# Altium footprint library 试用版PCB3D封装库.PcbLib: 91 footprints (part 1 of 6)
Each footprint in its own frame and in the unit in brackets; x right, y up, seen from the top. Pads: shape width x height; smd on the part's side, far side on the other; paste and mask are expansions set on the pad; w line width, h text height; cw(c..) or ccw(c..) is an arc to the next point about the centre after c.
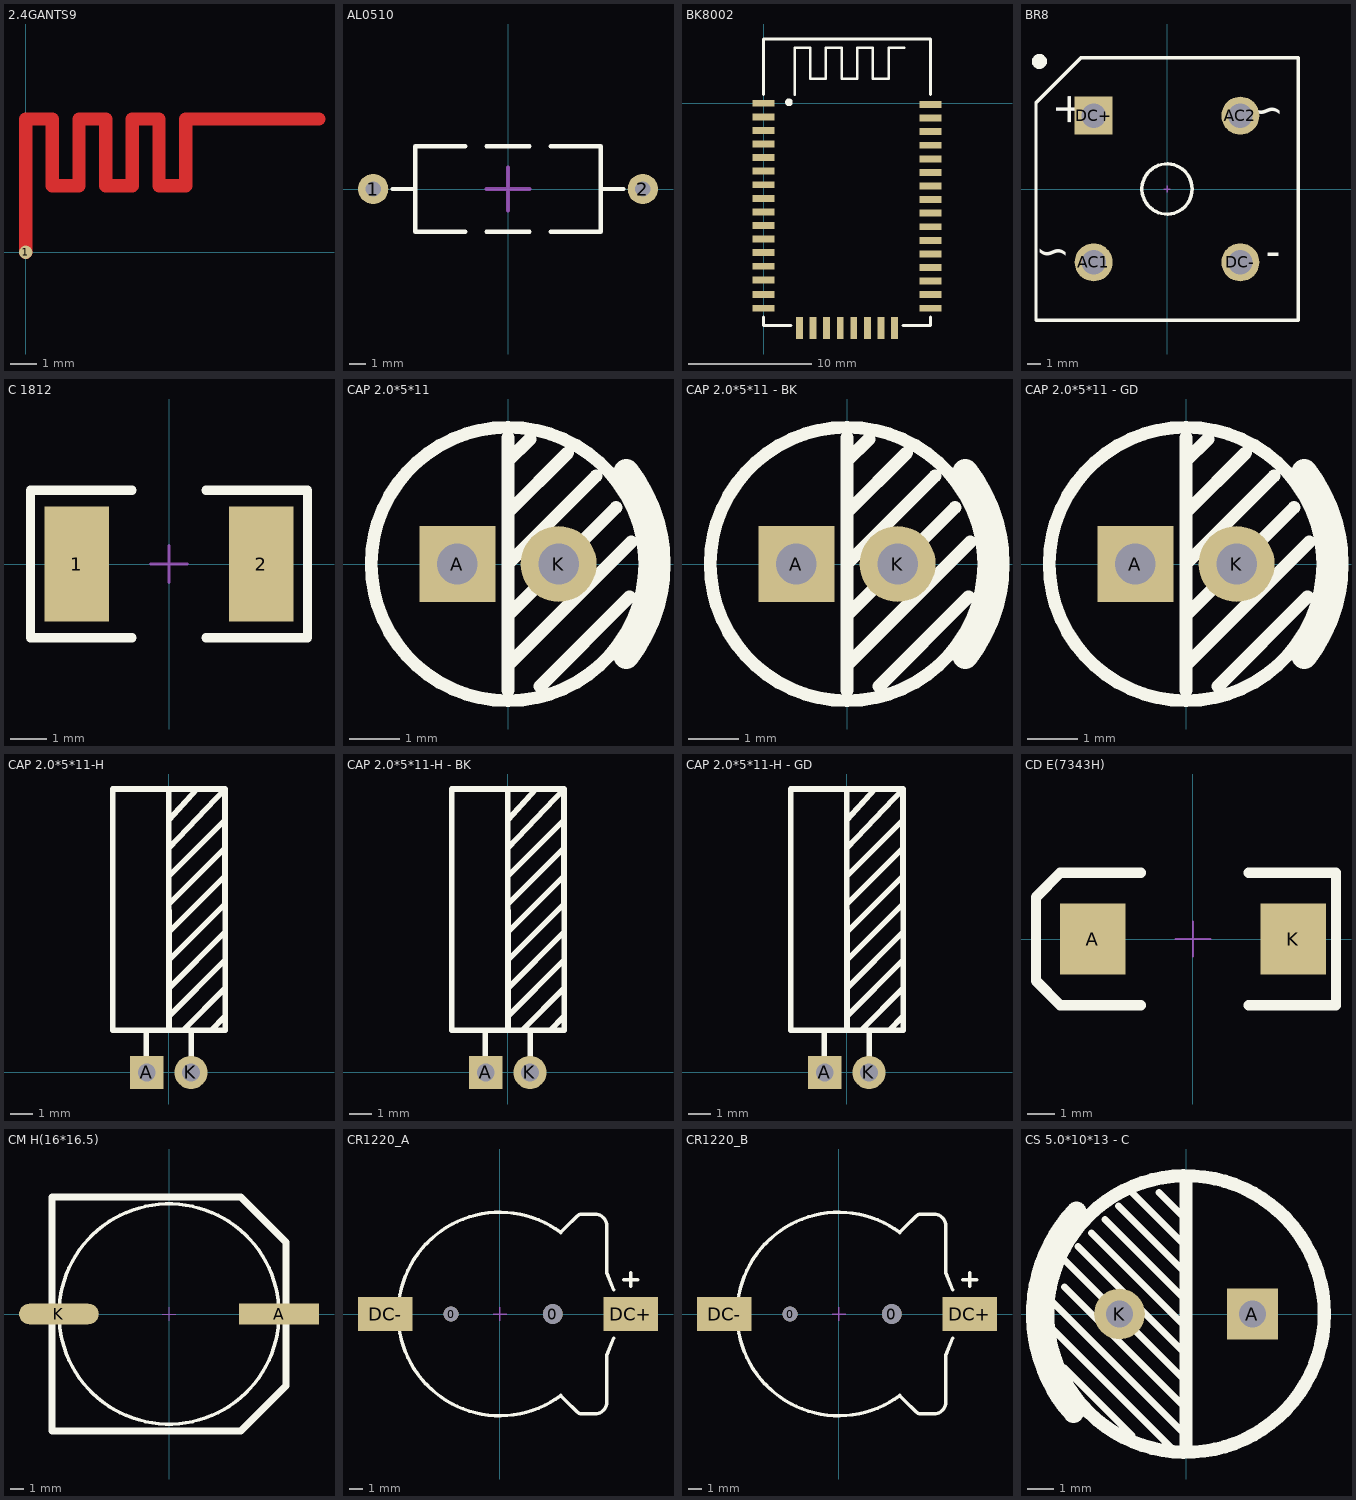
[diagram p0: the footprints below, top view; thin cyan lines are the x and y axes]

## 2.4GANTS9 [mm] "https://weidian.com/?userid=1231109981"
pads (1):
  round 0.5 smd: 1(0,0)
Top Layer:
  lines w0.5: 0,0 0,5 1,5 1,2.5 2,2.5 2,4.96 ; 2,5 3,5 3,2.5 4,2.5 4,4.99 ; 4,5 5,5 5,2.5 6,2.5 6,5 11,5

## AL0510 [mm] "16*5*10.5mm（脚距，直径，长度）"
pads (2):
  round 1.8 hole 0.9: 1(-8,0) 2(8,0)
Top Overlay:
  lines w0.254: -6.858,0 -5.5,0 ; -2.54,-2.54 -5.5,-2.54 -5.5,2.54 -2.54,2.54 ; -1.27,-2.54 1.27,-2.54 ; -1.27,2.54 1.27,2.54 ; 2.54,-2.54 5.5,-2.54 5.5,2.54 2.54,2.54 ; 5.5,0 6.858,0
Mechanical 15:
  lines w0.254: -1.27,0 1.27,0 ; 0,-1.27 0,1.27
3D body: height 5.06, standoff -3.5, extent -8.35,-2.509 8.35,2.509

## BK8002 [mil] "https://weidian.com/?userid=1231109981"
pads (40):
  rect 70x22 smd: 1(0,0) 2(0,-43.31) 3(0,-86.61) 4(0,-129.92) 5(0,-173.23) 6(0,-216.54) 7(0,-259.84) 8(0,-303.15) 9(0,-346.46) 10(0,-389.76) 11(0,-433.07) 12(0,-476.38) 13(0,-519.68) 14(0,-562.99) 15(0,-610.24) 16(0,-653.54) 25(531.5,-653.54) 26(531.5,-610.24) 27(531.5,-566.93) 28(531.5,-523.62) 29(531.5,-480.31) 30(531.5,-437.01) 31(531.5,-393.7) 32(531.5,-350.39) 33(531.5,-307.09) 34(531.5,-263.78) 35(531.5,-220.47) 36(531.5,-177.17) 37(531.5,-133.86) 38(531.5,-90.55) 39(531.5,-47.24) 40(531.5,-3.94)
  rect 22x70 smd: 17(114.17,-716.54) 18(157.48,-716.54) 19(200.79,-716.54) 20(244.09,-716.54) 21(287.4,-716.54) 22(330.71,-716.54) 23(374.02,-716.54) 24(417.32,-716.54)
Top Overlay:
  circle w12: c80.76,3 r6
  lines w8: 98.43,27.56 98.43,177.56 148.43,177.56 148.43,77.56 198.43,77.56 198.43,177.56 248.43,177.56 248.43,77.56 298.43,77.56 298.43,177.56 348.43,177.56 348.43,77.56 398.43,77.56 398.43,177.56 448.43,177.56
  lines w10: 0,-681.1 0,-708.66 86.61,-708.66 ; 0,27.56 0,204.72 531.5,204.72 531.5,27.56 ; 444.88,-708.66 531.5,-708.66 531.5,-681.1
3D body: height 84.37, standoff -1.09, extent -0.78,-713.08 532.29,192.92

## BR8 [mm] "16*8mm(宽高)"
pads (4):
  round 2.8 hole 1.8: AC1(-5.4,-5.4) AC2(5.4,5.4) DC-(5.4,-5.4)
  rect 2.8x2.8 hole 1.8: DC+(-5.4,5.4)
Top Overlay:
  circle w0.254: c0,0 r1.85
  circle w0.6: c-9.398,9.398 r0.254
  lines w0.254: -9.652,-9.652 -9.652,6.35 -6.35,9.652 9.652,9.652 9.652,-9.652 -9.652,-9.652
  text "+" at -8.89,4.572 h3.81
  text "-" at 8.382,-6.35 h3.81
  text "~" at 8.636,4.064 h3.81
  text "~" at -7.112,-6.35 h3.81
Mechanical 15:
  lines w0.1: -0.254,0 0.254,0 ; 0,-0.254 0,0.254
3D body: height 7.1, standoff -3.5, extent -9.45,-9.45 9.45,9.45

## C 1812 [mil] "无极性贴片电容"
pads (2):
  rect 70x125 smd: 1(-100,0) 2(100,0)
Top Overlay:
  lines w10: -40,-80 -150,-80 -150,80 -70,80 -50,80 -40,80 ; 40,-80 50,-80 150,-80 150,80 50,80 40,80
Mechanical 15:
  lines w3: -20,0 20,0 ; 0,-20 0,20
3D body: height 79.13, standoff -0.39, extent -90.55,-63.39 90.55,63.39

## CAP 2.0*5*11 [mm] "脚距2mm直径5mm高度11mm"
pads (2):
  rect 1.5x1.5 hole 0.8: A(-1,0)
  round 1.5 hole 0.8: K(1,0)
Top Overlay:
  circle w0.254: c0,0 r2.7
  lines w0.254: 0,-2.5 0,-2 ; 0,-1.016 2.134,1.118 ; 0,0 1.74,1.74 ; 0,1.016 1.181,2.197 ; 0,2.032 0.432,2.464 ; 0,2.5 0,-2 ; 0.635,-2.413 2.4,-0.648 ; 2.435,0.435 0,-2
  lines w0.5: 2.338,-1.819 ccw(c0,0) 2.338,1.819
3D body: height 11.04, standoff -3.42, extent -2.5,-2.499 2.51,2.499

## CAP 2.0*5*11 - BK [mm] "脚距2mm直径5mm高度11mm"
pads (2):
  rect 1.5x1.5 hole 0.8: A(-1,0)
  round 1.5 hole 0.8: K(1,0)
Top Overlay:
  circle w0.254: c0,0 r2.7
  lines w0.254: 0,-2.5 0,-2 ; 0,-1.016 2.134,1.118 ; 0,0 1.74,1.74 ; 0,1.016 1.181,2.197 ; 0,2.032 0.432,2.464 ; 0,2.5 0,-2 ; 0.635,-2.413 2.4,-0.648 ; 2.435,0.435 0,-2
  lines w0.5: 2.338,-1.819 ccw(c0,0) 2.338,1.819
3D body: height 11.04, standoff -3.42, extent -2.5,-2.499 2.51,2.499

## CAP 2.0*5*11 - GD [mm] "脚距2mm直径5mm高度11mm"
pads (2):
  rect 1.5x1.5 hole 0.8: A(-1,0)
  round 1.5 hole 0.8: K(1,0)
Top Overlay:
  circle w0.254: c0,0 r2.7
  lines w0.254: 0,-2.5 0,-2 ; 0,-1.016 2.134,1.118 ; 0,0 1.74,1.74 ; 0,1.016 1.181,2.197 ; 0,2.032 0.432,2.464 ; 0,2.5 0,-2 ; 0.635,-2.413 2.4,-0.648 ; 2.435,0.435 0,-2
  lines w0.5: 2.338,-1.819 ccw(c0,0) 2.338,1.819
3D body: height 11.04, standoff -3.42, extent -2.5,-2.499 2.51,2.499

## CAP 2.0*5*11-H [mm] "脚距2mm直径5mm高度11mm"
pads (2):
  rect 1.5x1.5 hole 0.8: A(-1,0)
  round 1.5 hole 0.8: K(1,0)
Top Overlay:
  lines w0.254: -1.016,0.762 -1.016,1.905 ; 0,2.54 2.548,5.08 ; 0,6.35 2.54,8.89 ; 0.001,11.43 1.27,12.827 ; 0,12.827 0.006,1.905 ; 0.001,10.16 2.54,12.827 ; 0.003,7.62 2.543,10.16 ; 0.002,8.89 2.541,11.43 ; 0.004,5.08 2.545,7.62 ; 0.005,3.81 2.547,6.35 ; 0.635,1.905 2.54,3.81 ; 1.016,0.762 1.016,1.905 ; 1.905,1.905 2.54,2.54 ; 2.54,12.827 2.552,1.905 -2.54,1.905 -2.54,12.827 2.54,12.827
3D body: height 5.02, standoff -3.48, extent -2.5,-0.25 2.51,12.96

## CAP 2.0*5*11-H - BK [mm] "脚距2mm直径5mm高度11mm"
pads (2):
  rect 1.5x1.5 hole 0.8: A(-1,0)
  round 1.5 hole 0.8: K(1,0)
Top Overlay:
  lines w0.254: -1.016,0.762 -1.016,1.905 ; 0,2.54 2.548,5.08 ; 0,6.35 2.54,8.89 ; 0.001,11.43 1.27,12.827 ; 0,12.827 0.006,1.905 ; 0.001,10.16 2.54,12.827 ; 0.003,7.62 2.543,10.16 ; 0.002,8.89 2.541,11.43 ; 0.004,5.08 2.545,7.62 ; 0.005,3.81 2.547,6.35 ; 0.635,1.905 2.54,3.81 ; 1.016,0.762 1.016,1.905 ; 1.905,1.905 2.54,2.54 ; 2.54,12.827 2.552,1.905 -2.54,1.905 -2.54,12.827 2.54,12.827
3D body: height 5.02, standoff -3.48, extent -2.5,-0.25 2.51,12.96

## CAP 2.0*5*11-H - GD [mm] "脚距2mm直径5mm高度11mm"
pads (2):
  rect 1.5x1.5 hole 0.8: A(-1,0)
  round 1.5 hole 0.8: K(1,0)
Top Overlay:
  lines w0.254: -1.016,0.762 -1.016,1.905 ; 0,2.54 2.548,5.08 ; 0,6.35 2.54,8.89 ; 0.001,11.43 1.27,12.827 ; 0,12.827 0.006,1.905 ; 0.001,10.16 2.54,12.827 ; 0.003,7.62 2.543,10.16 ; 0.002,8.89 2.541,11.43 ; 0.004,5.08 2.545,7.62 ; 0.005,3.81 2.547,6.35 ; 0.635,1.905 2.54,3.81 ; 1.016,0.762 1.016,1.905 ; 1.905,1.905 2.54,2.54 ; 2.54,12.827 2.552,1.905 -2.54,1.905 -2.54,12.827 2.54,12.827
3D body: height 5.02, standoff -3.48, extent -2.5,-0.25 2.51,12.96

## CD E(7343H) [mm] "长7.3mm，宽4.3mm，厚4.0mm"
pads (2):
  rect 2.4x2.6 smd: A(-3.65,0) K(3.65,0)
Top Overlay:
  lines w0.381: -1.905,-2.413 -4.826,-2.413 -5.715,-1.524 -5.715,1.524 -4.826,2.413 -1.905,2.413 ; 2.032,-2.413 5.207,-2.413 5.207,2.413 2.032,2.413
Mechanical 15:
  lines w0.076: -0.635,0 0.635,0 ; 0,-0.635 0,0.635
3D body: height 4, standoff -0.01, extent -3.65,-2.15 3.65,2.15

## CM H(16*16.5) [mm] "贴片电解电容，直径16mm，高16.5mm"
pads (2):
  rect 5.8x1.5 smd: A(8.001,0)
  oval 5.8x1.5 smd: K(-8.001,0)
Top Overlay:
  circle w0.254: c0,0 r8
  lines w0.508: -8.5,-8.5 -8.5,8.5 5.216,8.5 8.5,5.216 8.5,-5.216 5.216,-8.5 -8.5,-8.5
Mechanical 15:
  lines w0.076: -0.508,0 0.508,0 ; 0,-0.508 0,0.508
3D body: height 16.5, standoff -0.01, extent -9.4,-8.5 9.4,8.5

## CR1220_A [mm] "纽扣电池座"
pads (4):
  round 1.1 hole 1.1: 0(-3.6,0)
  round 1.45 hole 1.45: 0(3.9,0)
  rect 4x2.5 smd: DC+(9.652,0) DC-(-8.458,0)
Top Overlay:
  lines w0.254: 4.5,-6 cw(c0,0) 4.5,6 ; 4.572,-6.096 4.826,-6.35 5.662,-7.186 ccw(c6.096,-6.753) 6.096,-7.366 7.007,-7.366 ccw(c7.007,-6.499) 7.874,-6.499 7.874,-3.048 8.382,-1.778 ; 4.572,6.096 4.826,6.35 5.662,7.186 cw(c6.096,6.753) 6.096,7.366 7.007,7.366 cw(c7.007,6.499) 7.874,6.499 7.874,3.048 8.382,1.778 ; 9.144,2.54 10.16,2.54 ; 9.652,2.032 9.652,3.048
Mechanical 15:
  lines w0.1: -0.508,0 0.508,0 ; 0,-0.508 0,0.508
3D body: height 4.05, standoff -0.85, extent -9.416,-7.45 10.34,7.45

## CR1220_B [mm] "纽扣电池座"
pads (4):
  round 1.1 hole 1.1: 0(-3.6,0)
  round 1.45 hole 1.45: 0(3.9,0)
  rect 4x2.5 smd: DC+(9.652,0) DC-(-8.458,0)
Top Overlay:
  lines w0.254: 4.5,-6 cw(c0,0) 4.5,6 ; 4.572,-6.096 4.826,-6.35 5.662,-7.186 ccw(c6.096,-6.753) 6.096,-7.366 7.007,-7.366 ccw(c7.007,-6.499) 7.874,-6.499 7.874,-3.048 8.382,-1.778 ; 4.572,6.096 4.826,6.35 5.662,7.186 cw(c6.096,6.753) 6.096,7.366 7.007,7.366 cw(c7.007,6.499) 7.874,6.499 7.874,3.048 8.382,1.778 ; 9.144,2.54 10.16,2.54 ; 9.652,2.032 9.652,3.048
Mechanical 15:
  lines w0.1: -0.508,0 0.508,0 ; 0,-0.508 0,0.508
3D body: height 4.05, standoff -0.85, extent -9.416,-7.45 10.34,7.45

## CS 5.0*10*13 - C [mm] "脚距5mm , 直径10mm , 高13mm"
pads (2):
  rect 1.9x1.9 hole 1: A(2.5,0)
  round 1.9 hole 1: K(-2.5,0)
Top Overlay:
  circle w0.5: c0,0 r5.2
  lines w0.254: -5.08,-0.508 -0.508,-5.08 ; -5.08,0.508 0,-4.572 ; -4.572,-2.032 -2.032,-4.572 ; -4.572,1.016 0,-3.556 ; -4.572,2.032 0,-2.54 ; -4.064,2.54 0,-1.524 ; -3.556,3.048 0,-0.508 ; -3.048,3.556 0,0.508 0,1.016 ; -2.54,4.064 0,1.524 ; -2.032,4.572 0,2.54 ; -1.016,4.572 0,3.556
  lines w0.5: 0,-5 0,5
  lines w0.75: -4.229,-3.731 cw(c0,0) -4.114,3.857
3D body: height 13.02, standoff -3.48, extent -5,-5 5,5